# Altium integrated library Sajad_Altium_Library.IntLib: 390 symbols (part 1 of 3)
Pins are listed as number, name and electrical type; pins without a type are passive.

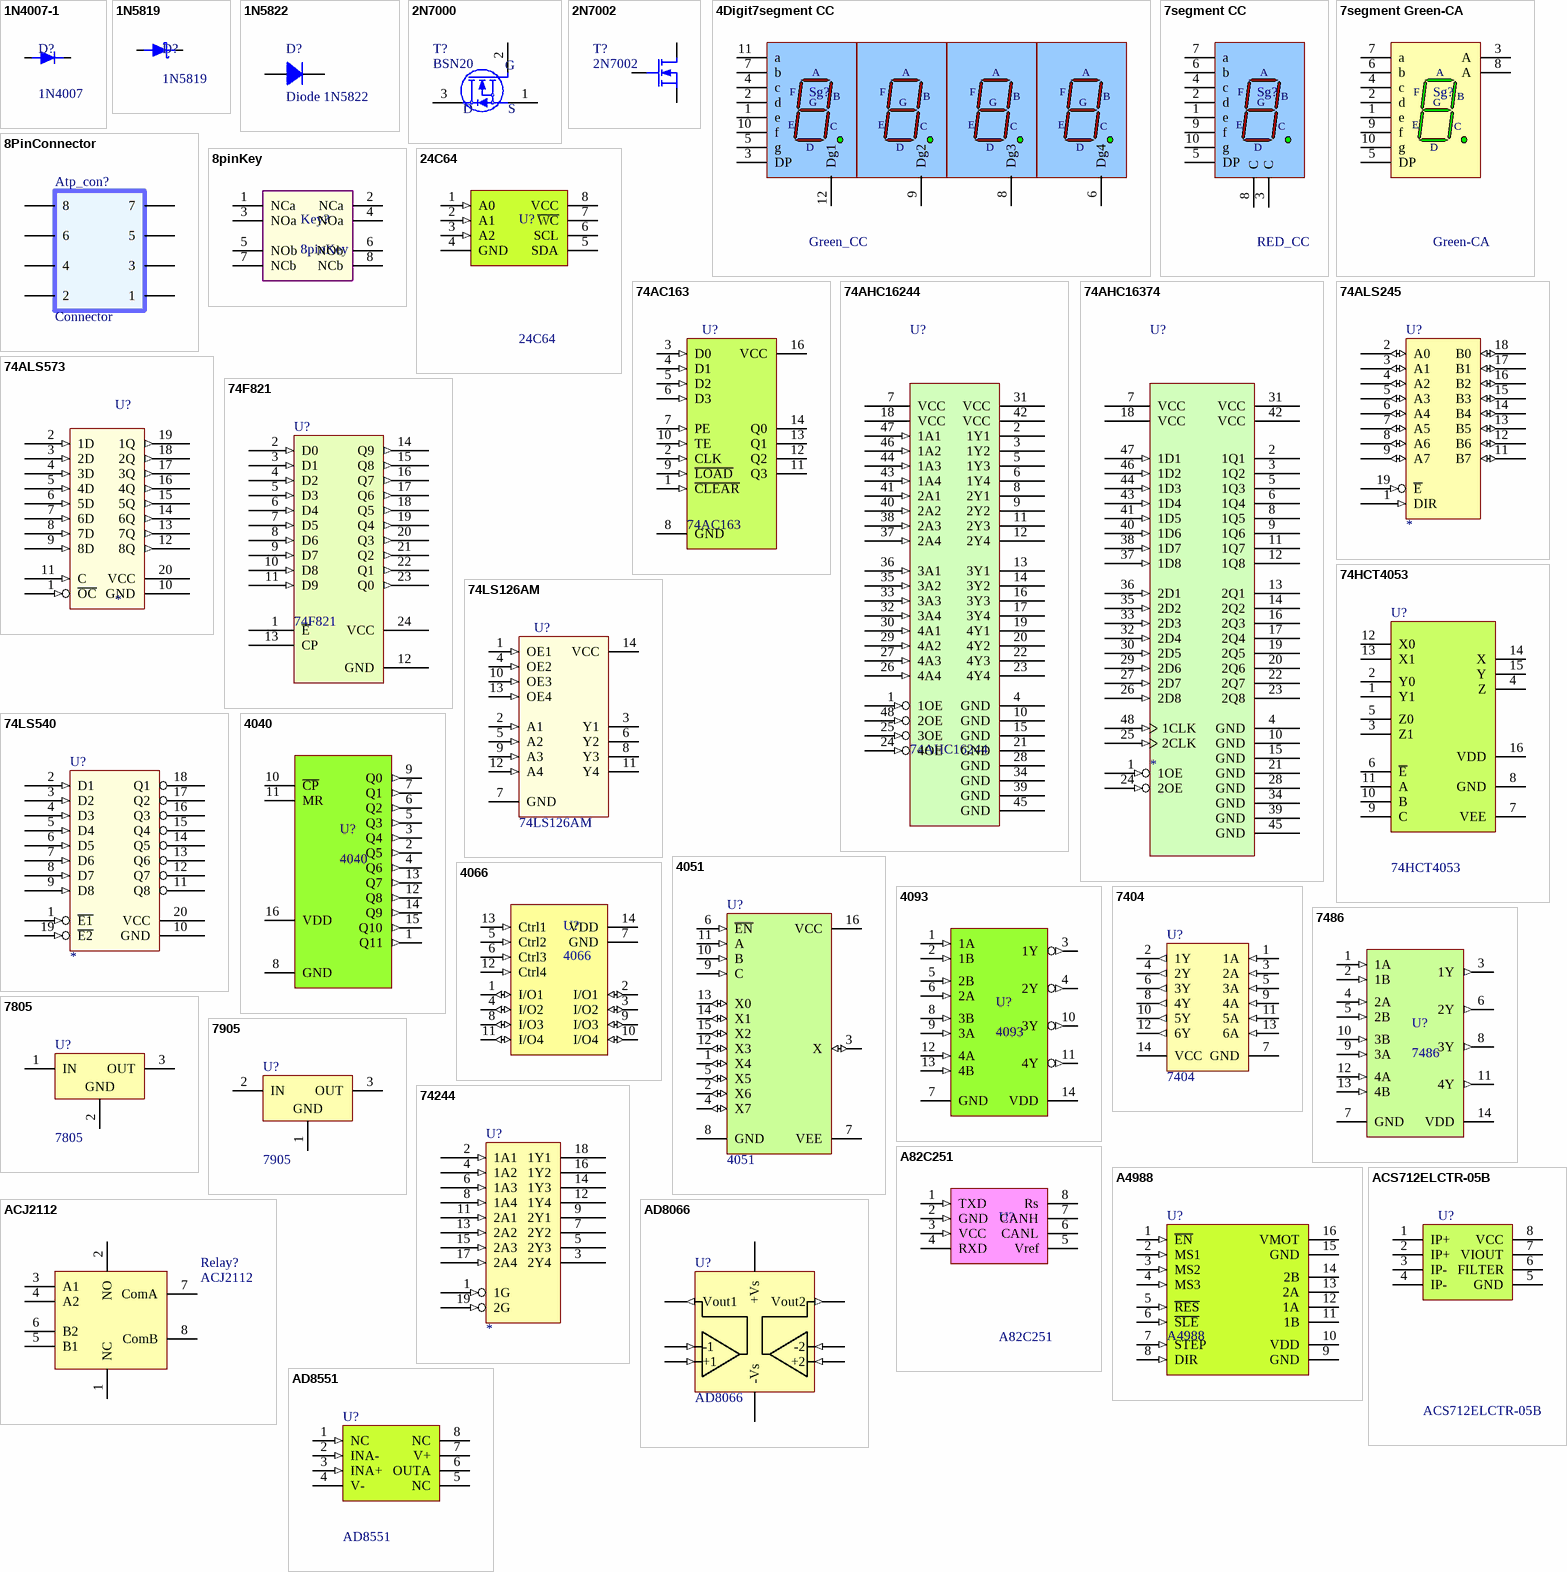
[diagram p0: symbols 1N4007-1 to AD8551]

## 1N4007-1
designator D?, comment 1N4007
1N4007 smd diode
footprint DO-214AC (1N4001-7 SMD DIODE)
footprint Diode -standing (Axial)
pins: 1 A, 2 K

## 1N5819
designator D?
1N5819 Schottky diode
footprint DO-214AC (1N4001-7 SMD DIODE)
footprint Diode -standing (Axial)
pins: 1 A, 2 K

## 1N5822
designator D?, comment Diode 1N5822
3 Amp Medium Power Silicon Rectifier Diode; Published: 8-Jun-2000; LatestRevisionDate: 17-Jul-2002; LatestRevisionNote: Re-released for DXP Platform.; DatasheetDocument: Aug-1984; PackageReference: DO-201AD; Publisher: Altium Limited; ComponentLink1Description: Manufacturer Link; ComponentLink1URL: http://www.irf.com/
footprint DO-201AD (Diode, Axial; Body 9.5 x 5.6 mm (LxDia. max), Lead Dia. 1.32 mm (max))
pins: 1 A, 2 K

## 2N7000
designator T?, comment BSN20
footprint SOT23-3L (Footprint not found)
footprint SOT23-213 (Footprint not found)
pins: 1 S, 2 G, 3 D

## 2N7002
designator T?
N-Channel Enhancement Mode Field Effect Transistor
footprint SOT23
pins: 1 G, 2 S, 3 D

## 4Digit7segment CC
designator Sg?, comment Green_CC
4 Digit 7-Segment Display: CC,; Colour: Green; ComponentLink1Description: Manufacturer Link; ComponentLink1URL: http://www.agilent.com/
footprint 4Digit 7SEGMENT
pins: 1 e "Cathode", 2 d "Cathode", 3 DP "Cathode", 4 c "Cathode", 5 g "Cathode", 6 Dg4 "Anode", 7 b "Cathode", 8 Dg3 "Anode", 9 Dg2 "Anode", 10 f "Cathode", 11 a "Cathode", 12 Dg1 "Anode"
text: A; F; B; G; E; C; D

## 7segment CC
designator Sg?, comment RED_CC
7-Segment Display: CC, RH DP; Colour: Green; ComponentLink1Description: Manufacturer Link; ComponentLink1URL: http://www.agilent.com/
footprint 7SEGMENT
pins: 1 e "Cathode", 2 d "Cathode", 3 C "Anode", 4 c "Cathode", 5 DP "Cathode", 6 b "Cathode", 7 a "Cathode", 8 C "Anode", 9 f "Cathode", 10 g "Cathode"
text: A; F; B; G; E; D

## 7segment Green-CA
designator Sg?, comment Green-CA
7-Segment Display: CA, RH DP; Colour: Green; ComponentLink1Description: Manufacturer Link; ComponentLink1URL: http://www.agilent.com/
footprint 7SEGMENT
pins: 1 e "Cathode", 2 d "Cathode", 3 A "Anode", 4 c "Cathode", 5 DP "Cathode", 6 b "Cathode", 7 a "Cathode", 8 A "Anode", 9 f "Cathode", 10 g "Cathode"
text: F; B; G; E; C; D

## 8PinConnector
designator Atp_con?, comment Connector
8PinConnector for Anti pinch 206
footprint 8pinConnector (8PinConnector for Anti pinch 206)
footprint 8PinConnector2 (ATP Connector)
pins: 1 (power), 2 (power), 3 (power), 4 (power), 5 (power), 6 (power), 7 (power), 8 (power)

## 8pinKey
designator Key?
footprint 8pinKey (8PinKey)
pins: 1 NCa, 2 NCa, 3 NOa, 4 NOa, 5 NOb, 6 NOb, 7 NCb, 8 NCb

## 24C64
designator U?
64Kbit Serial I²C Bus EEPROM
footprint SO8
pins: 1 A0 (in), 2 A1 (in), 3 A2 (in), 4 GND (power), 5 SDA (power), 6 SCL, 7 ~{WC} (power), 8 VCC (power)

## 74AC163
designator U?
SYNCHRONOUS PRESETTABLE 4-BIT COUNTER
footprint SO16
pins: 1 ~{CLEAR} (in), 2 CLK (in), 3 D0 (in), 4 D1 (in), 5 D2 (in), 6 D3 (in), 7 PE (in), 8 GND (power), 9 ~{LOAD} (in), 10 TE (in), 11 Q3 (hiz), 12 Q2 (hiz), 13 Q1 (hiz), 14 Q0 (hiz), 16 VCC (power)

## 74AHC16244
designator U?
16-Bit Buffer with 3-State Outputs
footprint TSSOP48
footprint TVSOP48
footprint SSOP48
pins: 1 1OE (in), 2 1Y1 (hiz), 3 1Y2 (hiz), 4 GND (power), 5 1Y3 (hiz), 6 1Y4 (hiz), 7 VCC (power), 8 2Y1 (hiz), 9 2Y2 (hiz), 10 GND (power), 11 2Y3 (hiz), 12 2Y4 (hiz), 13 3Y1 (hiz), 14 3Y2 (hiz), 15 GND (power), 16 3Y3 (hiz), 17 3Y4 (hiz), 18 VCC (power), 19 4Y1 (hiz), 20 4Y2 (hiz), 21 GND (power), 22 4Y3 (hiz), 23 4Y4 (hiz), 24 4OE (in), 25 3OE (in), 26 4A4 (in), 27 4A3 (in), 28 GND (power), 29 4A2 (in), 30 4A1 (in), 31 VCC (power), 32 3A4 (in), 33 3A3 (in), 34 GND (power), 35 3A2 (in), 36 3A1 (in), 37 2A4 (in), 38 2A3 (in), 39 GND (power), 40 2A2 (in), 41 2A1 (in), 42 VCC (power), 43 1A4 (in), 44 1A3 (in), 45 GND (power), 46 1A2 (in), 47 1A1 (in), 48 2OE (in)

## 74AHC16374
designator U?
16-Bit Edge-Triggered D-Type Flip-Flops with 3-State Outputs
footprint TSSOP48
footprint TVSOP48
footprint SSOP48
pins: 1 1OE (in), 2 1Q1 (hiz), 3 1Q2 (hiz), 4 GND (power), 5 1Q3 (hiz), 6 1Q4 (hiz), 7 VCC (power), 8 1Q5 (hiz), 9 1Q6 (hiz), 10 GND (power), 11 1Q7 (hiz), 12 1Q8 (hiz), 13 2Q1 (hiz), 14 2Q2 (hiz), 15 GND (power), 16 2Q3 (hiz), 17 2Q4 (hiz), 18 VCC (power), 19 2Q5 (hiz), 20 2Q6 (hiz), 21 GND (power), 22 2Q7 (hiz), 23 2Q8 (hiz), 24 2OE (in), 25 2CLK (in), 26 2D8 (in), 27 2D7 (in), 28 GND (power), 29 2D6 (in), 30 2D5 (in), 31 VCC (power), 32 2D4 (in), 33 2D3 (in), 34 GND (power), 35 2D2 (in), 36 2D1 (in), 37 1D8 (in), 38 1D7 (in), 39 GND (power), 40 1D6 (in), 41 1D5 (in), 42 VCC (power), 43 1D4 (in), 44 1D3 (in), 45 GND (power), 46 1D2 (in), 47 1D1 (in), 48 1CLK (in)

## 74ALS245
designator U?
Octal Bus Transceiver
footprint DIP20
footprint SOL-20
footprint DIPS20
footprint SSOP20
pins: 1 DIR (in), 2 A0 (io), 3 A1 (io), 4 A2 (io), 5 A3 (io), 6 A4 (io), 7 A5 (io), 8 A6 (io), 9 A7 (io), 10 GND (power) hidden to GND, 11 B7 (io), 12 B6 (io), 13 B5 (io), 14 B4 (io), 15 B3 (io), 16 B2 (io), 17 B1 (io), 18 B0 (io), 19 ~{E} (in), 20 VCC (power) hidden to VCC

## 74ALS573
designator U?
Octal Transparent Latch
footprint DIP20
footprint SOL-20
footprint SSOP20
pins: 1 ~{OC} (in), 2 1D (in), 3 2D (in), 4 3D (in), 5 4D (in), 6 5D (in), 7 6D (in), 8 7D (in), 9 8D (in), 10 GND (power), 11 C (in), 12 8Q (out), 13 7Q (out), 14 6Q (out), 15 5Q (out), 16 4Q (out), 17 3Q (out), 18 2Q (out), 19 1Q (out), 20 VCC (power)

## 74F821
designator U?
10-bit bus interface register, non-inverting (3-State)
pins: 1 ~{E}, 2 D0 (in), 3 D1 (in), 4 D2 (in), 5 D3 (in), 6 D4 (in), 7 D5 (in), 8 D6 (in), 9 D7 (in), 10 D8 (in), 11 D9 (in), 12 GND (power), 13 CP, 14 Q9 (out), 15 Q8 (out), 16 Q7 (out), 17 Q6 (out), 18 Q5 (out), 19 Q4 (out), 20 Q3 (out), 21 Q2 (out), 22 Q1 (out), 23 Q0 (out), 24 VCC (power)

## 74HCT4053
designator U?
Triple 2-channel analog multiplexer/demultiplexer
footprint SO16
pins: 1 Y1, 2 Y0, 3 Z1, 4 Z, 5 Z0, 6 ~{E}, 7 VEE (power), 8 GND (power), 9 C, 10 B, 11 A, 12 X0, 13 X1, 14 X, 15 Y, 16 VDD (power)

## 74LS126AM
designator U?
Quad 3-State Buffer; Published: 17-Jul-2002; LatestRevisionDate: 13-Apr-2006; LatestRevisionNote: IPC-7351 Footprint Added.; DatasheetVersion: Mar-1998; PackageVersion: 2000; PackageReference: M14A; Publisher: Altium Limited; PackageDescription: 14-Pin Small Outline Integrated Circuit 1.27 mm Pitch; Code_IPC: SOIC127P600-14; ComponentLink1Description: Manufacturer Link; ComponentLink1URL: http://www.fairchildsemi.com/
footprint SO14_M (SOIC, 14-Leads, Body 8.7x3.9mm, Pitch 1.27mm, IPC Low Density)
footprint SO14_Big
pins: 1 OE1 (in), 2 A1 (in), 3 Y1 (hiz), 4 OE2 (in), 5 A2 (in), 6 Y2 (hiz), 7 GND (power), 8 Y3 (hiz), 9 A3 (in), 10 OE3 (in), 11 Y4 (hiz), 12 A4 (in), 13 OE4 (in), 14 VCC (power)

## 74LS540
designator U?
Octal Inverting Buffer
footprint DIP20
footprint SOL-20
footprint DIPS20
footprint SSOP20
pins: 1 ~{E1} (in), 2 D1 (in), 3 D2 (in), 4 D3 (in), 5 D4 (in), 6 D5 (in), 7 D6 (in), 8 D7 (in), 9 D8 (in), 10 GND (power), 11 Q8 (hiz), 12 Q7 (hiz), 13 Q6 (hiz), 14 Q5 (hiz), 15 Q4 (hiz), 16 Q3 (hiz), 17 Q2 (hiz), 18 Q1 (hiz), 19 ~{E2} (in), 20 VCC (power)

## 4040
designator U?
12-stage binary ripple counter
footprint SO16
pins: 1 Q11 (out), 2 Q5 (out), 3 Q4 (out), 4 Q6 (out), 5 Q3 (out), 6 Q2 (out), 7 Q1 (out), 8 GND (power), 9 Q0 (out), 10 ~{CP}, 11 MR, 12 Q8 (out), 13 Q7 (out), 14 Q9 (out), 15 Q10 (out), 16 VDD (power)

## 4051
designator U?
8-Channel Analog Multiplexer/Demultiplexer; Published: 17-Jul-2002; LatestRevisionDate: 13-Apr-2006; LatestRevisionNote: IPC-7351 Footprint Added.; DatasheetVersion: Jan-1999; PackageVersion: 2000; PackageReference: M16A; Publisher: Altium Limited; PackageDescription: 16-Pin Small Outline Integrated Circuit 1.27 mm Pitch; Code_IPC: SOIC127P600-16; ComponentLink1Description: Manufacturer Link; ComponentLink1URL: http://www.fairchildsemi.com/; ComponentLink2Description: Datasheet; ComponentLink2URL: http://www.fairchildsemi.com/ds/CD%2FCD4052BC.pdf
footprint SO16
pins: 1 X4 (io), 2 X6 (io), 3 X (io), 4 X7 (io), 5 X5 (io), 6 ~{EN} (in), 7 VEE (power), 8 GND (power), 9 C (in), 10 B (in), 11 A (in), 12 X3 (io), 13 X0 (io), 14 X1 (io), 15 X2 (io), 16 VCC (power)

## 4066
designator U?
4066 analog switch
footprint DIP14 (DIP; 14 Leads; Row Spacing 7.62 mm; Pitch 2.54 mm)
pins: 1 I/O1 (io), 2 I/O1 (io), 3 I/O2 (io), 4 I/O2 (io), 5 Ctrl2 (in), 6 Ctrl3 (in), 7 GND (power), 8 I/O3 (io), 9 I/O3 (io), 10 I/O4 (io), 11 I/O4 (io), 12 Ctrl4 (in), 13 Ctrl1 (in), 14 VDD (power)

## 4093
designator U?
Quad 2-Input NAND Schmitt-Trigger
footprint DIP14 (DIP; 14 Leads; Row Spacing 7.62 mm; Pitch 2.54 mm)
footprint SO14_M (SOIC, 14-Leads, Body 8.7x3.9mm, Pitch 1.27mm, IPC Low Density)
pins: 1 1A (in), 2 1B (in), 3 1Y (out), 4 2Y (out), 5 2B (in), 6 2A (in), 7 GND (power), 8 3B (in), 9 3A (in), 10 3Y (out), 11 4Y (out), 12 4A (in), 13 4B (in), 14 VDD (power)

## 7404
designator U?
7404 NOT Gate; Published: 13-Oct-2000; LatestRevisionDate: 13-Apr-2006; LatestRevisionNote: IPC-7351 Footprint Added.; DatasheetVersion: 1998; PackageReference: L16; Publisher: Altium Limited; PackageDescription: 16-Pin Small Outline Integrated Circuit 1.27 mm Pitch; Code_JEDEC: MS-012-AC; Code_IPC: SOIC127P600-16; ComponentLink1Description: Manufacturer Link; ComponentLink1URL: http://www.allegromicro.com/
footprint SO14_M (SOIC, 14-Leads, Body 8.7x3.9mm, Pitch 1.27mm, IPC Low Density)
pins: 1 1A (in), 2 1Y (out), 3 2A (in), 4 2Y (out), 5 3A (in), 6 3Y (out), 7 GND (power), 8 4Y (out), 9 4A (in), 10 5Y (out), 11 5A (in), 12 6Y (out), 13 6A (in), 14 VCC

## 7486
designator U?
Quad 2-Input Exclusive-OR Gate
footprint DIP14 (DIP; 14 Leads; Row Spacing 7.62 mm; Pitch 2.54 mm)
footprint SO14_M (SOIC, 14-Leads, Body 8.7x3.9mm, Pitch 1.27mm, IPC Low Density)
pins: 1 1A (in), 2 1B (in), 3 1Y (out), 4 2A (in), 5 2B (in), 6 2Y (out), 7 GND (power), 8 3Y (out), 9 3A (in), 10 3B (in), 11 4Y (out), 12 4A (in), 13 4B (in), 14 VDD (power)

## 7805
designator U?
Three-Terminal Positive Voltage Regulator; Note: Heatsink surface is connected to Pin 2; DatasheetVersion: 1997; PackageVersion: 1997; PackageReference: 221A-06; Publisher: Altium Limited; PackageDescription: TO, Thru-Hole, Vertical, Heatsink Mounted; 3 In-Line Leads; Pitch 2.54 mm; Code_JEDEC: TO-262-AA; ComponentLink1Description: Manufacturer Link; ComponentLink1URL: http://www.onsemi.com/site/products/taxonomy/0,4438,503,00.html; ComponentLink2Description: Datasheet; ComponentLink2URL: http://www.onsemi.com/pub/Collateral/MC7800-D.PDF
footprint 7905 Requlator_HeatSink (7905 Negative Regulator with Heat sink)
footprint 7805_Requlator (7805 Positive Regulator)
footprint 7805 smd
pins: 1 IN (power), 2 GND (power), 3 OUT (power)

## 7905
designator U?
Three-Terminal Negative Fixed Voltage Regulator; Note: Heatsink suface connected to pin 2.; Published: 17-Jul-2002; DatasheetVersion: 1988; PackageReference: 221A-04; Publisher: Altium Limited; PackageDescription: TO, Thru-Hole, Vertical, Heatsink Mounted; 3 In-Line Leads; Pitch 2.54 mm; Code_JEDEC: TO-262-AA; ComponentLink1Description: Manufacturer Link; ComponentLink1URL: http://www.onsemi.com/site/products/taxonomy/0,4438,503,00.html; ComponentLink2Description: Datasheet; ComponentLink2URL: http://www.onsemi.com/pub/Collateral/MC7900-D.PDF
footprint 7905 Requlator_HeatSink (7905 Negative Regulator with Heat sink)
footprint 7905_Requlator (7905 Negative Regulator)
pins: 1 GND (power), 2 IN (power), 3 OUT (power)

## 74244
designator U?
Octal Buffer
footprint DIP20
footprint SOL-20
footprint DIPS20
footprint SSOP20
pins: 1 1G (in), 2 1A1 (in), 3 2Y4 (hiz), 4 1A2 (in), 5 2Y3 (hiz), 6 1A3 (in), 7 2Y2 (hiz), 8 1A4 (in), 9 2Y1 (hiz), 10 GND (power) hidden to GND, 11 2A1 (in), 12 1Y4 (hiz), 13 2A2 (in), 14 1Y3 (hiz), 15 2A3 (in), 16 1Y2 (hiz), 17 2A4 (in), 18 1Y1 (hiz), 19 2G (in), 20 VCC (power) hidden to VCC

## A82C251
designator U?
CAN transceiver for 24 V systems; Link: http://javanelec.com/productsDetails.aspx?id=5836; Price: 24,670 Rial
footprint SO8
pins: 1 TXD (in), 2 GND (in), 3 VCC (in), 4 RXD (power), 5 Vref (power), 6 CANL, 7 CANH (power), 8 Rs (power)

## A4988
designator U?
A4988 Stepper Motor Driver
footprint A4988 (Stepper Motor Driver)
pins: 1 ~{EN} (in), 2 MS1 (in), 3 MS2 (in), 4 MS3 (in), 5 ~{RES} (in), 6 ~{SLE} (in), 7 STEP (in), 8 DIR (in), 9 GND (power), 10 VDD (power), 11 1B, 12 1A, 13 2A, 14 2B, 15 GND (power), 16 VMOT (power)

## ACJ2112
designator Relay?
SUPER MINIATURE  PC BOARD TYPE  AUTOMOTIVE RELAY
footprint ACJ2112
pins: 1 NC (power) "Normally Closed", 2 NO (power) "Normally Opened", 3 A1 "Coil A", 4 A2 "Coil A", 5 B1 "Coil B", 6 B2 "Coil B", 7 ComA (power) "Common A", 8 ComB (power) "Common B"

## ACS712ELCTR-05B
designator U?
Fully Integrated, Hall Effect-Based Linear Current Sensor IC; Link: http://www.javanelec.com/Shops/Index?searchFilter=ACS712
footprint SO8
pins: 1 IP+, 2 IP+, 3 IP-, 4 IP-, 5 GND (power), 6 FILTER (power), 7 VIOUT (power), 8 VCC (power)

## AD8066
designator U?
footprint MSOP-8
pins: 1 Vout1 (out), 2 -1 (in), 3 +1 (in), 4 -Vs (power), 5 +2 (in), 6 -2 (in), 7 Vout2 (out), 8 +Vs (power)

## AD8551
designator U?
Zero-Drift, Single-Supply, Rail-to-Rail  Input/Output Operational Amplifiers
footprint SO8
pins: 1 NC (in), 2 INA- (in), 3 INA+ (in), 4 V- (power), 5 NC (power), 6 OUTA, 7 V+ (power), 8 NC (power)

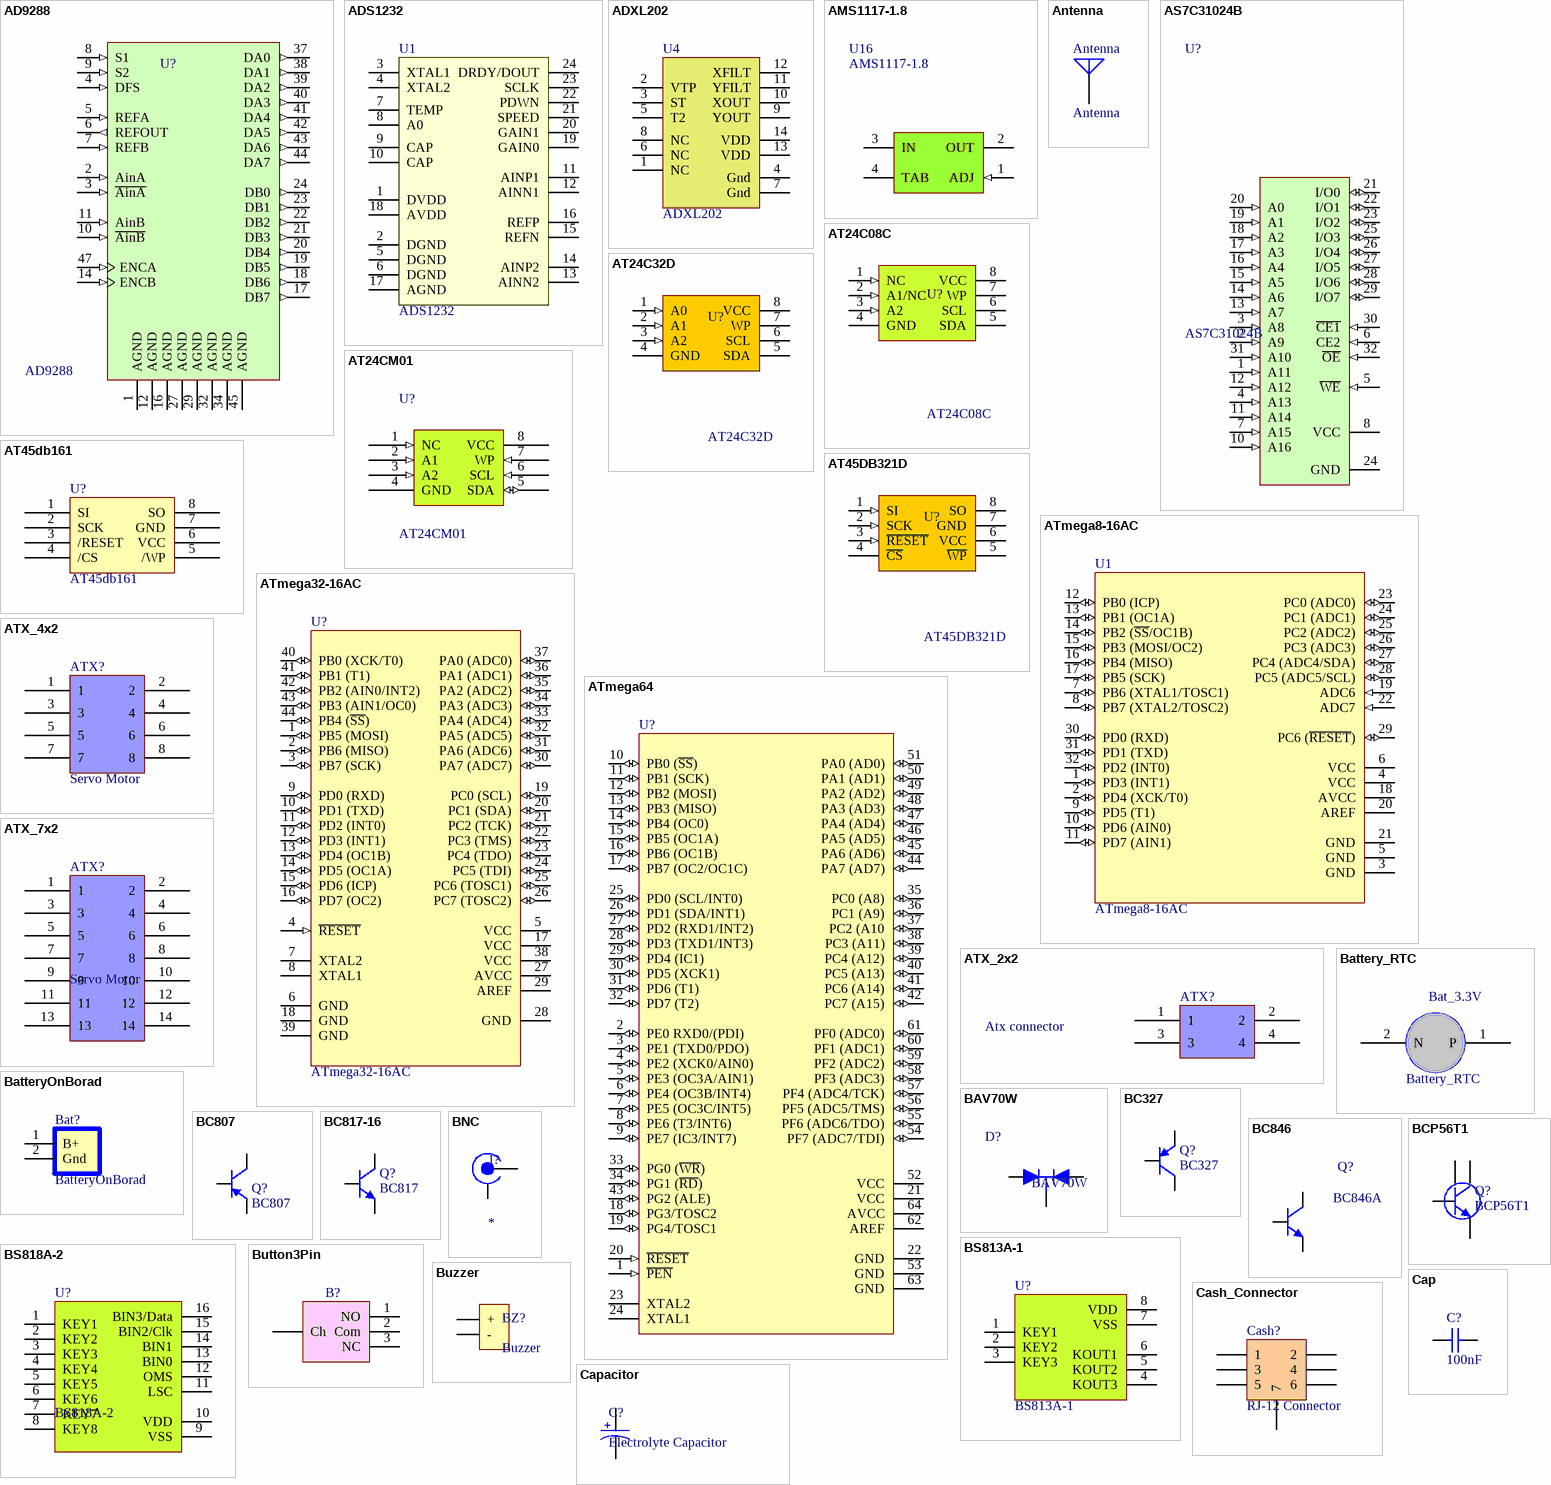
[diagram p1: symbols AD9288 to Cash_Connector]

## AD9288
designator U?
Dual Channel ADC
footprint QFP24-7x7
pins: 1 AGND (power), 2 AinA (in), 3 ~{AinA} (in), 4 DFS (in), 5 REFA (in), 6 REFOUT (out), 7 REFB (in), 8 S1 (in), 9 S2 (in), 10 ~{AinB} (in), 11 AinB (in), 12 AGND (power), 13 VD (power), 14 ENCB (in), 15 VDD (power), 16 AGND (power), 17 DB7 (out), 18 DB6 (out), 19 DB5 (out), 20 DB4 (out), 21 DB3 (out), 22 DB2 (out), 23 DB1 (out), 24 DB0 (out), 27 AGND (power), 28 VDD (power), 29 AGND (power), 30 VD (power), 31 VD (power), 32 AGND (power), 33 VDD (power), 34 AGND (power), 37 DA0 (out), 38 DA1 (out), 39 DA2 (out), 40 DA3 (out), 41 DA4 (out), 42 DA5 (out), 43 DA6 (out), 44 DA7 (out), 45 AGND (power), 46 VDD (power), 47 ENCA (in), 48 VD (power)

## ADS1232
designator U1
Ultra Low-Noise, 24-Bit Analog-to-Digital Converter
footprint TSSOP 24 (SSOP, Plastic; 24 Leads; Body Width 5.3 mm; Pitch 0.65 mm)
pins: 1 DVDD, 2 DGND, 3 XTAL1, 4 XTAL2, 5 DGND, 6 DGND, 7 TEMP, 8 A0, 9 CAP, 10 CAP, 11 AINP1, 12 AINN1, 13 AINN2, 14 AINP2, 15 REFN, 16 REFP, 17 AGND, 18 AVDD, 19 GAIN0, 20 GAIN1, 21 SPEED, 22 PDWN, 23 SCLK, 24 DRDY/DOUT

## ADXL202
designator U4
Accelerometers with Digital Output
footprint ADXL202 (Accelerometers with Digital Output)
pins: 1 NC, 2 VTP, 3 ST, 4 Gnd, 5 T2, 6 NC, 7 Gnd, 8 NC, 9 YOUT, 10 XOUT, 11 YFILT, 12 XFILT, 13 VDD, 14 VDD

## AMS1117-1.8
designator U16
footprint SOT223
pins: 1 ADJ (in), 2 OUT (power), 3 IN (power), 4 TAB (power)

## Antenna
designator Antenna
Generic Antenna; Published: 24-Mar-1999; LatestRevisionDate: 17-Jul-2002; LatestRevisionNote: Re-released for DXP Platform.; PackageReference: PIN1; Publisher: Altium Limited
footprint Antenna1Side
pins: 1 A

## AS7C31024B
designator U?
Alliance 1 Mbit (128k x 8bit) SRAM
footprint TSOP-32 8x20mm (Use with AS7C31024B)
pins: 1 A11 (in), 2 A9 (in), 3 A8 (in), 4 A13 (in), 5 ~{WE} (in), 6 CE2 (in), 7 A15 (in), 8 VCC (power), 10 A16 (in), 11 A14 (in), 12 A12 (in), 13 A7 (in), 14 A6 (in), 15 A5 (in), 16 A4 (in), 17 A3 (in), 18 A2 (in), 19 A1 (in), 20 A0 (in), 21 I/O0 (io), 22 I/O1 (io), 23 I/O2 (io), 24 GND (power), 25 I/O3 (io), 26 I/O4 (io), 27 I/O5 (io), 28 I/O6 (io), 29 I/O7 (io), 30 ~{CE1} (in), 31 A10 (in), 32 ~{OE} (in)

## AT24C08C
designator U?
I2C-Compatible  (2-wire)  Serial EEPROM 8Kbit (1024 x 8); Link: http://javanelec.com/productsDetails.aspx?id=3442; Price: 3150 Rial
footprint SO8
pins: 1 NC (in), 2 A1/NC (in), 3 A2 (in), 4 GND (power), 5 SDA (power), 6 SCL, 7 WP (power), 8 VCC (power)

## AT24C32D
designator U?
2-Wire Serial  Electrically  Erasable and  Programmable  Read-only  Memory
footprint SO8
pins: 1 A0 (in), 2 A1 (in), 3 A2 (in), 4 GND (power), 5 SDA (power), 6 SCL, 7 WP (power), 8 VCC (power)

## AT24CM01
designator U?
1-Megabit Two-wire Serial  EEPROM; Designer: OMIGA
footprint TSSOP-8
pins: 1 NC (in) "Address Bit 1", 2 A1 (in) "Address Bit 2", 3 A2 (in) "Address Bit 3", 4 GND (power) "Ground", 5 SDA (io) "Serial Data", 6 SCL (in) "Serial Clock", 7 WP (in) "Write Protect", 8 VCC (power) "Power"

## AT45db161
designator U?
footprint SO8
pins: 1 SI, 2 SCK, 3 /RESET, 4 /CS, 5 /WP, 6 VCC, 7 GND, 8 SO